# Altium footprint library rescap.PcbLib: 82 footprints (part 4 of 6)
Each footprint in its own frame and in the unit in brackets; x right, y up, seen from the top. Pads: shape width x height; smd on the part's side, far side on the other; paste and mask are expansions set on the pad; w line width, h text height; cw(c..) or ccw(c..) is an arc to the next point about the centre after c.
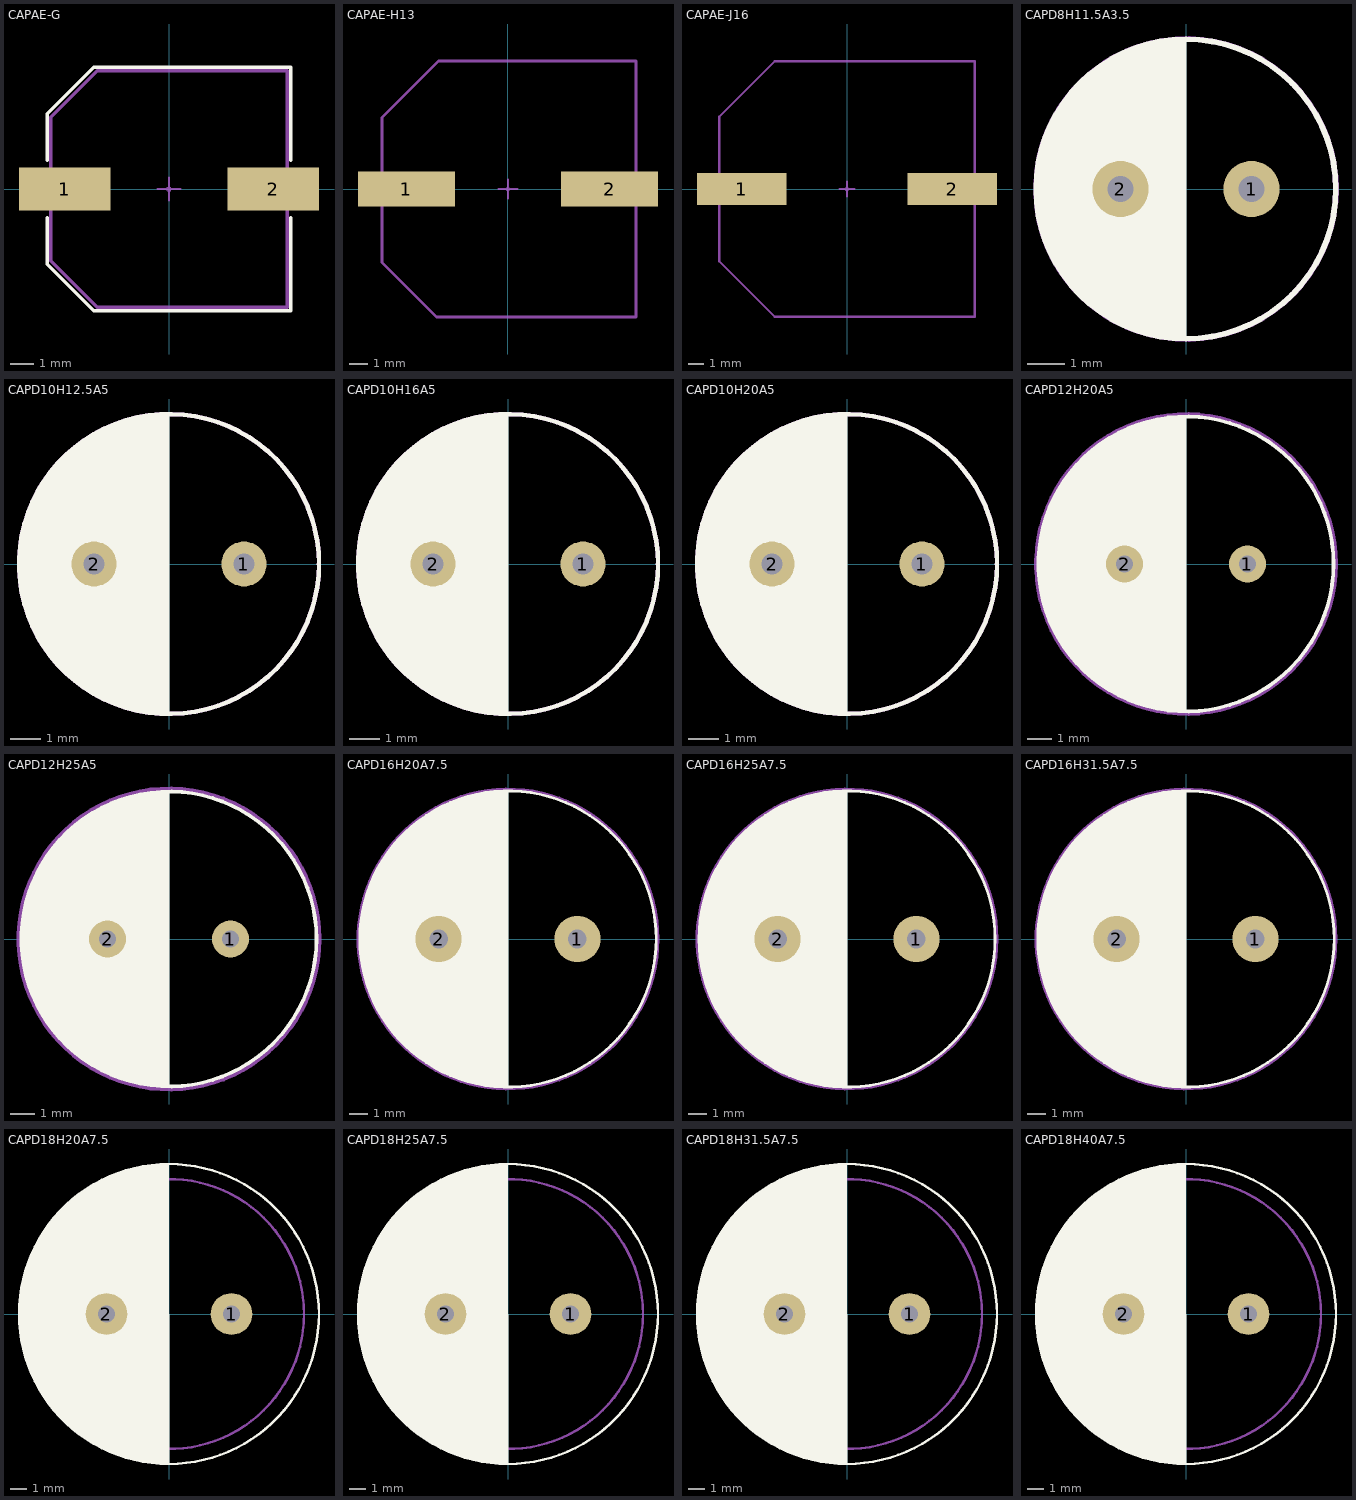
[diagram p3: the footprints below, top view; thin cyan lines are the x and y axes]

## CAPAE-G [mm] "Aluminum Electrolytic Capacitor, Body 10,30x10,30x10,20mm, IPC High Density"
height 10.2
pads (2):
  rect 3.95x1.85 smd: 1(-4.5,0) 2(4.5,0)
Top Overlay:
  lines w0.15: -5.25,-1.25 -5.25,-3.25 -3.25,-5.25 -3,-5.25 5.25,-5.25 5.25,-1.25 ; -5.25,1.25 -5.25,3.25 -3.25,5.25 -3,5.25 5.25,5.25 5.25,1.25
Top Courtyard:
  lines w0.05: -0.075,-0.075 0.075,-0.075 0.075,0.075 -0.075,0.075 -0.075,-0.075
  lines w0.1: -0.5,0 0.5,0 ; 0,-0.5 0,0.5
  lines w0.15: -5.1,-3.1 -5.1,-1 -5.1,1 -5.1,3.1 -3.1,5.1 5.1,5.1 5.1,1 5.1,-1 5.1,-5.1 -3.1,-5.1 -5.1,-3.1
3D body "CAPAE120103X102L.step": height 10.2, standoff 0, extent -6,-5.15 6,5.15

## CAPAE-H13 [mm] "Aluminum Electrolytic Capacitor, Body 13,50x13,50x13,50mm, IPC High Density"
height 13.5
pads (2):
  rect 5.15x1.85 smd: 1(-5.4,0) 2(5.4,0)
Top Courtyard:
  lines w0.05: -0.075,-0.075 -0.075,0.075 0.075,0.075 0.075,-0.075 -0.075,-0.075
  lines w0.1: -0.5,0 0.5,0 ; 0,-0.5 0,0.5
  lines w0.15: -6.7,-3.9 -6.7,-1.1 -6.7,1.1 -6.7,3.8 -3.7,6.8 6.8,6.8 6.8,1.1 6.8,-1.1 6.8,-6.8 -3.8,-6.8 -6.7,-3.9
3D body "CAPAE150135X135L.step": height 13.5, standoff 0, extent -7.5,-6.75 7.5,6.75

## CAPAE-J16 [mm] "Aluminum Electrolytic Capacitor, Body 17,00x17,00x16,50mm, IPC High Density"
height 16.5
pads (2):
  rect 5.95x2.15 smd: 1(-7,0) 2(7,0)
Top Courtyard:
  lines w0.05: -0.075,-0.075 0.075,-0.075 0.075,0.075 -0.075,0.075 -0.075,-0.075
  lines w0.1: -0.5,0 0.5,0 ; 0,-0.5 0,0.5
  lines w0.15: -8.5,-4.8 -4.8,-8.5 8.5,-8.5 8.5,-1.1 8.5,1.1 8.5,8.5 -4.8,8.5 -8.5,4.8 -8.5,1.1 -8.5,-1.1 -8.5,-4.8
3D body "CAPAE190170X165L.step": height 16.5, standoff 0, extent -9.5,-8.5 9.5,8.5

## CAPD8H11.5A3.5 [mm]
height 11.5
pads (2):
  round 1.5 hole 0.7: 1(1.75,0) 2(-1.75,0)
Top Overlay:
  circle w0.15: c0,0 r4
  region: 0,-4 -0.262,-4 -0.782,-3.932 -1.289,-3.796 -1.773,-3.595 -2.227,-3.333 -2.643,-3.014 -3.014,-2.643 -3.333,-2.227 -3.595,-1.773 -3.796,-1.289 -3.932,-0.782 -4,-0.262 -4,0 -4,0.262 -3.932,0.782 -3.796,1.289 -3.595,1.773 -3.333,2.227 -3.014,2.643 -2.643,3.014 -2.227,3.333 -1.773,3.595 -1.289,3.796 -0.782,3.932 -0.262,4 0,4
Mechanical 29:
  circle w0.15: c0,0 r4.005
  lines w0.15: -2.5,-1 -2.5,1
  text ".Designator" at -2.1,-0.3 h1
3D body "CAP D8 H11.5 A3.5.STEP": height 12, standoff -2.3, extent -4.01,-4 4,4

## CAPD10H12.5A5 [mm]
height 12.5
pads (2):
  round 1.5 hole 0.7: 1(2.5,0) 2(-2.5,0)
Top Overlay:
  circle w0.15: c0,0 r5
  region: 0,-5 -0.328,-5 -0.978,-4.914 -1.611,-4.745 -2.216,-4.494 -2.784,-4.166 -3.304,-3.767 -3.767,-3.304 -4.166,-2.784 -4.494,-2.216 -4.745,-1.611 -4.914,-0.978 -5,-0.328 -5,0 -5,0.328 -4.914,0.978 -4.745,1.611 -4.494,2.216 -4.166,2.784 -3.767,3.304 -3.304,3.767 -2.784,4.166 -2.216,4.494 -1.611,4.745 -0.978,4.914 -0.328,5 0,5
Mechanical 29:
  circle w0.15: c0,0 r5
  lines w0.15: -3.7,-1 -3.7,0 -3.7,1
  text ".Designator" at -2.7,-0.4 h1
3D body: height 12.5, standoff 0, extent -4.999,-4.999 4.999,4.999

## CAPD10H16A5 [mm]
height 16
pads (2):
  round 1.5 hole 0.7: 1(2.5,0) 2(-2.5,0)
Top Overlay:
  circle w0.15: c0,0 r5
  region: 0,-5 -0.328,-5 -0.978,-4.914 -1.611,-4.745 -2.216,-4.494 -2.784,-4.166 -3.304,-3.767 -3.767,-3.304 -4.166,-2.784 -4.494,-2.216 -4.745,-1.611 -4.914,-0.978 -5,-0.328 -5,0 -5,0.328 -4.914,0.978 -4.745,1.611 -4.494,2.216 -4.166,2.784 -3.767,3.304 -3.304,3.767 -2.784,4.166 -2.216,4.494 -1.611,4.745 -0.978,4.914 -0.328,5 0,5
Mechanical 29:
  circle w0.15: c0,0 r5
  lines w0.15: -3.7,-1 -3.7,0 -3.7,1
  text ".Designator" at -2.1,-0.3 h1
3D body: height 16, standoff 0, extent -4.999,-4.999 4.999,4.999

## CAPD10H20A5 [mm]
height 20
pads (2):
  round 1.5 hole 0.7: 1(2.5,0) 2(-2.5,0)
Top Overlay:
  circle w0.15: c0,0 r5
  region: 0,-5 -0.328,-5 -0.978,-4.914 -1.611,-4.745 -2.216,-4.494 -2.784,-4.166 -3.304,-3.767 -3.767,-3.304 -4.166,-2.784 -4.494,-2.216 -4.745,-1.611 -4.914,-0.978 -5,-0.328 -5,0 -5,0.328 -4.914,0.978 -4.745,1.611 -4.494,2.216 -4.166,2.784 -3.767,3.304 -3.304,3.767 -2.784,4.166 -2.216,4.494 -1.611,4.745 -0.978,4.914 -0.328,5 0,5
  pour cut-out: -2.5,-1.75 -2.672,-1.75 -3.01,-1.683 -3.329,-1.551 -3.616,-1.359 -3.859,-1.116 -4.051,-0.829 -4.183,-0.51 -4.25,-0.172 -4.25,0 -4.25,0.172 -4.183,0.51 -4.051,0.829 -3.859,1.116 -3.616,1.359 -3.329,1.551 -3.01,1.683 -2.672,1.75 -2.5,1.75 -2.328,1.75 -1.99,1.683 -1.671,1.551 -1.384,1.359 -1.141,1.116 -0.949,0.829 -0.817,0.51 -0.75,0.172 -0.75,0 -0.75,-0.172 -0.817,-0.51 -0.949,-0.829 -1.141,-1.116 -1.384,-1.359 -1.671,-1.551 -1.99,-1.683 -2.328,-1.75
Mechanical 29:
  circle w0.15: c0,0 r5
  lines w0.15: -3.7,-1 -3.7,0 -3.7,1
  text ".Designator" at -2.7,-0.2 h1
3D body: height 20, standoff 0, extent -4.999,-4.999 4.999,4.999

## CAPD12H20A5 [mm]
height 20
pads (2):
  round 1.5 hole 0.7: 1(2.5,0) 2(-2.5,0)
Top Overlay:
  circle w0.15: c0,0 r6
  region: 0,-6 -0.295,-6 -0.881,-5.942 -1.46,-5.827 -2.024,-5.656 -2.568,-5.43 -3.088,-5.153 -3.578,-4.825 -4.034,-4.451 -4.451,-4.034 -4.825,-3.579 -5.153,-3.088 -5.43,-2.568 -5.656,-2.024 -5.827,-1.46 -5.942,-0.881 -6,-0.295 -6,0 -6,0.295 -5.942,0.881 -5.827,1.46 -5.656,2.024 -5.43,2.568 -5.153,3.088 -4.825,3.578 -4.451,4.034 -4.034,4.451 -3.579,4.825 -3.088,5.153 -2.568,5.43 -2.024,5.656 -1.46,5.827 -0.881,5.942 -0.295,6 0,6
  pour cut-out: -2.5,-1.75 -2.672,-1.75 -3.01,-1.683 -3.329,-1.551 -3.616,-1.359 -3.859,-1.116 -4.051,-0.829 -4.183,-0.51 -4.25,-0.172 -4.25,0 -4.25,0.172 -4.183,0.51 -4.051,0.829 -3.859,1.116 -3.616,1.359 -3.329,1.551 -3.01,1.683 -2.672,1.75 -2.5,1.75 -2.328,1.75 -1.99,1.683 -1.671,1.551 -1.384,1.359 -1.141,1.116 -0.949,0.829 -0.817,0.51 -0.75,0.172 -0.75,0 -0.75,-0.172 -0.817,-0.51 -0.949,-0.829 -1.141,-1.116 -1.384,-1.359 -1.671,-1.551 -1.99,-1.683 -2.328,-1.75
Mechanical 29:
  circle w0.15: c0,0 r6.1
  lines w0.15: -3.7,-1 -3.7,0 -3.7,1
  text ".Designator" at -2.8,-0.4 h1
3D body: height 20, standoff 0, extent -6,-6 6,6

## CAPD12H25A5 [mm]
height 25
pads (2):
  round 1.5 hole 0.7: 1(2.5,0) 2(-2.5,0)
Top Overlay:
  circle w0.15: c0,0 r6
  pour cut-out: -2.5,-1.75 -2.672,-1.75 -3.01,-1.683 -3.329,-1.551 -3.616,-1.359 -3.859,-1.116 -4.051,-0.829 -4.183,-0.51 -4.25,-0.172 -4.25,0 -4.25,0.172 -4.183,0.51 -4.051,0.829 -3.859,1.116 -3.616,1.359 -3.329,1.551 -3.01,1.683 -2.672,1.75 -2.5,1.75 -2.328,1.75 -1.99,1.683 -1.671,1.551 -1.384,1.359 -1.141,1.116 -0.949,0.829 -0.817,0.51 -0.75,0.172 -0.75,0 -0.75,-0.172 -0.817,-0.51 -0.949,-0.829 -1.141,-1.116 -1.384,-1.359 -1.671,-1.551 -1.99,-1.683 -2.328,-1.75
  region: 0,-6 -0.295,-6 -0.881,-5.942 -1.46,-5.827 -2.024,-5.656 -2.568,-5.43 -3.088,-5.153 -3.578,-4.825 -4.034,-4.451 -4.451,-4.034 -4.825,-3.579 -5.153,-3.088 -5.43,-2.568 -5.656,-2.024 -5.827,-1.46 -5.942,-0.881 -6,-0.295 -6,0 -6,0.295 -5.942,0.881 -5.827,1.46 -5.656,2.024 -5.43,2.568 -5.153,3.088 -4.825,3.578 -4.451,4.034 -4.034,4.451 -3.579,4.825 -3.088,5.153 -2.568,5.43 -2.024,5.656 -1.46,5.827 -0.881,5.942 -0.295,6 0,6
Top Courtyard:
  circle w0.2: c0,0 r6.1
Mechanical 29:
  circle w0.15: c0,0 r6.101
  lines w0.15: -3.7,-1 -3.7,0 -3.7,1
  text ".Designator" at -2.6,-0.3 h1
3D body "User Library-Cap-EL(12_5x25-5).step": height 25.1, standoff -3.2, extent -6.252,-6.25 6.25,6.25

## CAPD16H20A7.5 [mm]
height 20
pads (2):
  round 2.5 hole 1: 1(3.75,0) 2(-3.75,0)
Top Overlay:
  circle w0.15: c0,0 r8
  region: 0,-8 -0.393,-8 -1.175,-7.923 -1.946,-7.77 -2.698,-7.541 -3.425,-7.241 -4.118,-6.87 -4.771,-6.433 -5.379,-5.935 -5.935,-5.379 -6.433,-4.771 -6.87,-4.118 -7.241,-3.425 -7.541,-2.698 -7.77,-1.946 -7.923,-1.175 -8,-0.393 -8,0 -8,0.393 -7.923,1.175 -7.77,1.946 -7.541,2.698 -7.241,3.425 -6.87,4.118 -6.433,4.771 -5.935,5.379 -5.379,5.935 -4.771,6.433 -4.118,6.87 -3.425,7.241 -2.698,7.541 -1.946,7.77 -1.175,7.923 -0.393,8 0,8
  pour cut-out: -3.75,-1.75 -3.922,-1.75 -4.26,-1.683 -4.579,-1.551 -4.866,-1.359 -5.109,-1.116 -5.301,-0.829 -5.433,-0.51 -5.5,-0.172 -5.5,0 -5.5,0.172 -5.433,0.51 -5.301,0.829 -5.109,1.116 -4.866,1.359 -4.579,1.551 -4.26,1.683 -3.922,1.75 -3.75,1.75 -3.578,1.75 -3.24,1.683 -2.921,1.551 -2.634,1.359 -2.391,1.116 -2.199,0.829 -2.067,0.51 -2,0.172 -2,0 -2,-0.172 -2.067,-0.51 -2.199,-0.829 -2.391,-1.116 -2.634,-1.359 -2.921,-1.551 -3.24,-1.683 -3.578,-1.75
Mechanical 29:
  circle w0.15: c0,0 r8.1
  lines w0.15: -3.7,-1 -3.7,0 -3.7,1
  text ".Designator" at -2.2,-0.4 h1
3D body: height 20, standoff 0, extent -7.999,-7.999 7.999,7.999

## CAPD16H25A7.5 [mm]
height 25
pads (2):
  round 2.5 hole 1: 1(3.75,0) 2(-3.75,0)
Top Overlay:
  circle w0.15: c0,0 r8
  region: 0,-8 -0.393,-8 -1.175,-7.923 -1.946,-7.77 -2.698,-7.541 -3.425,-7.241 -4.118,-6.87 -4.771,-6.433 -5.379,-5.935 -5.935,-5.379 -6.433,-4.771 -6.87,-4.118 -7.241,-3.425 -7.541,-2.698 -7.77,-1.946 -7.923,-1.175 -8,-0.393 -8,0 -8,0.393 -7.923,1.175 -7.77,1.946 -7.541,2.698 -7.241,3.425 -6.87,4.118 -6.433,4.771 -5.935,5.379 -5.379,5.935 -4.771,6.433 -4.118,6.87 -3.425,7.241 -2.698,7.541 -1.946,7.77 -1.175,7.923 -0.393,8 0,8
  pour cut-out: -3.75,-1.75 -3.922,-1.75 -4.26,-1.683 -4.579,-1.551 -4.866,-1.359 -5.109,-1.116 -5.301,-0.829 -5.433,-0.51 -5.5,-0.172 -5.5,0 -5.5,0.172 -5.433,0.51 -5.301,0.829 -5.109,1.116 -4.866,1.359 -4.579,1.551 -4.26,1.683 -3.922,1.75 -3.75,1.75 -3.578,1.75 -3.24,1.683 -2.921,1.551 -2.634,1.359 -2.391,1.116 -2.199,0.829 -2.067,0.51 -2,0.172 -2,0 -2,-0.172 -2.067,-0.51 -2.199,-0.829 -2.391,-1.116 -2.634,-1.359 -2.921,-1.551 -3.24,-1.683 -3.578,-1.75
Mechanical 29:
  circle w0.15: c0,0 r8.101
  lines w0.15: -3.7,-1 -3.7,0 -3.7,1
  text ".Designator" at -2.4,-0.3 h1
3D body: height 25, standoff 0, extent -7.999,-7.999 7.999,7.999

## CAPD16H31.5A7.5 [mm]
height 31.5
pads (2):
  round 2.5 hole 1: 1(3.75,0) 2(-3.75,0)
Top Overlay:
  circle w0.15: c0,0 r8
  region: 0,-8 -0.393,-8 -1.175,-7.923 -1.946,-7.77 -2.698,-7.541 -3.425,-7.241 -4.118,-6.87 -4.771,-6.433 -5.379,-5.935 -5.935,-5.379 -6.433,-4.771 -6.87,-4.118 -7.241,-3.425 -7.541,-2.698 -7.77,-1.946 -7.923,-1.175 -8,-0.393 -8,0 -8,0.393 -7.923,1.175 -7.77,1.946 -7.541,2.698 -7.241,3.425 -6.87,4.118 -6.433,4.771 -5.935,5.379 -5.379,5.935 -4.771,6.433 -4.118,6.87 -3.425,7.241 -2.698,7.541 -1.946,7.77 -1.175,7.923 -0.393,8 0,8
  pour cut-out: -3.75,-1.75 -3.922,-1.75 -4.26,-1.683 -4.579,-1.551 -4.866,-1.359 -5.109,-1.116 -5.301,-0.829 -5.433,-0.51 -5.5,-0.172 -5.5,0 -5.5,0.172 -5.433,0.51 -5.301,0.829 -5.109,1.116 -4.866,1.359 -4.579,1.551 -4.26,1.683 -3.922,1.75 -3.75,1.75 -3.578,1.75 -3.24,1.683 -2.921,1.551 -2.634,1.359 -2.391,1.116 -2.199,0.829 -2.067,0.51 -2,0.172 -2,0 -2,-0.172 -2.067,-0.51 -2.199,-0.829 -2.391,-1.116 -2.634,-1.359 -2.921,-1.551 -3.24,-1.683 -3.578,-1.75
Mechanical 29:
  circle w0.15: c0,0 r8.1
  lines w0.15: -3.7,-1 -3.7,0 -3.7,1
  text ".Designator" at -2.3,-0.2 h1
3D body: height 31.5, standoff 0, extent -7.999,-7.999 7.999,7.999

## CAPD18H20A7.5 [mm]
height 20
pads (2):
  round 2.5 hole 1: 1(3.75,0) 2(-3.75,0)
Top Overlay:
  circle w0.15: c0,0 r9
  pour cut-out: -3.75,-1.75 -3.922,-1.75 -4.26,-1.683 -4.579,-1.551 -4.866,-1.359 -5.109,-1.116 -5.301,-0.829 -5.433,-0.51 -5.5,-0.172 -5.5,0 -5.5,0.172 -5.433,0.51 -5.301,0.829 -5.109,1.116 -4.866,1.359 -4.579,1.551 -4.26,1.683 -3.922,1.75 -3.75,1.75 -3.578,1.75 -3.24,1.683 -2.921,1.551 -2.634,1.359 -2.391,1.116 -2.199,0.829 -2.067,0.51 -2,0.172 -2,0 -2,-0.172 -2.067,-0.51 -2.199,-0.829 -2.391,-1.116 -2.634,-1.359 -2.921,-1.551 -3.24,-1.683 -3.578,-1.75
  region: 0,-9 -0.442,-9 -1.322,-8.913 -2.189,-8.741 -3.036,-8.484 -3.853,-8.146 -4.633,-7.729 -5.368,-7.238 -6.051,-6.677 -6.677,-6.051 -7.238,-5.368 -7.729,-4.633 -8.146,-3.853 -8.484,-3.036 -8.741,-2.189 -8.913,-1.322 -9,-0.442 -9,0 -9,0.442 -8.913,1.322 -8.741,2.189 -8.484,3.036 -8.146,3.853 -7.729,4.632 -7.238,5.368 -6.677,6.051 -6.051,6.677 -5.368,7.238 -4.633,7.729 -3.853,8.146 -3.036,8.484 -2.189,8.741 -1.322,8.913 -0.442,9 0,9
Mechanical 29:
  circle w0.15: c0,0 r8.1
  lines w0.15: -3.7,-1 -3.7,0 -3.7,1
  text ".Designator" at -2.2,-0.4 h1
3D body: height 20, standoff 0, extent -9,-9 9,9

## CAPD18H25A7.5 [mm]
height 25
pads (2):
  round 2.5 hole 1: 1(3.75,0) 2(-3.75,0)
Top Overlay:
  circle w0.15: c0,0 r9
  pour cut-out: -3.75,-1.75 -3.922,-1.75 -4.26,-1.683 -4.579,-1.551 -4.866,-1.359 -5.109,-1.116 -5.301,-0.829 -5.433,-0.51 -5.5,-0.172 -5.5,0 -5.5,0.172 -5.433,0.51 -5.301,0.829 -5.109,1.116 -4.866,1.359 -4.579,1.551 -4.26,1.683 -3.922,1.75 -3.75,1.75 -3.578,1.75 -3.24,1.683 -2.921,1.551 -2.634,1.359 -2.391,1.116 -2.199,0.829 -2.067,0.51 -2,0.172 -2,0 -2,-0.172 -2.067,-0.51 -2.199,-0.829 -2.391,-1.116 -2.634,-1.359 -2.921,-1.551 -3.24,-1.683 -3.578,-1.75
  region: 0,-9 -0.442,-9 -1.322,-8.913 -2.189,-8.741 -3.036,-8.484 -3.853,-8.146 -4.633,-7.729 -5.368,-7.238 -6.051,-6.677 -6.677,-6.051 -7.238,-5.368 -7.729,-4.633 -8.146,-3.853 -8.484,-3.036 -8.741,-2.189 -8.913,-1.322 -9,-0.442 -9,0 -9,0.442 -8.913,1.322 -8.741,2.189 -8.484,3.036 -8.146,3.853 -7.729,4.632 -7.238,5.368 -6.677,6.051 -6.051,6.677 -5.368,7.238 -4.633,7.729 -3.853,8.146 -3.036,8.484 -2.189,8.741 -1.322,8.913 -0.442,9 0,9
Mechanical 29:
  circle w0.15: c0,0 r8.1
  lines w0.15: -3.7,-1 -3.7,0 -3.7,1
  text ".Designator" at -2.2,-0.4 h1
3D body: height 25, standoff 0, extent -9,-9 9,9

## CAPD18H31.5A7.5 [mm]
height 25
pads (2):
  round 2.5 hole 1: 1(3.75,0) 2(-3.75,0)
Top Overlay:
  circle w0.15: c0,0 r9
  pour cut-out: -3.75,-1.75 -3.922,-1.75 -4.26,-1.683 -4.579,-1.551 -4.866,-1.359 -5.109,-1.116 -5.301,-0.829 -5.433,-0.51 -5.5,-0.172 -5.5,0 -5.5,0.172 -5.433,0.51 -5.301,0.829 -5.109,1.116 -4.866,1.359 -4.579,1.551 -4.26,1.683 -3.922,1.75 -3.75,1.75 -3.578,1.75 -3.24,1.683 -2.921,1.551 -2.634,1.359 -2.391,1.116 -2.199,0.829 -2.067,0.51 -2,0.172 -2,0 -2,-0.172 -2.067,-0.51 -2.199,-0.829 -2.391,-1.116 -2.634,-1.359 -2.921,-1.551 -3.24,-1.683 -3.578,-1.75
  region: 0,-9 -0.442,-9 -1.322,-8.913 -2.189,-8.741 -3.036,-8.484 -3.853,-8.146 -4.633,-7.729 -5.368,-7.238 -6.051,-6.677 -6.677,-6.051 -7.238,-5.368 -7.729,-4.633 -8.146,-3.853 -8.484,-3.036 -8.741,-2.189 -8.913,-1.322 -9,-0.442 -9,0 -9,0.442 -8.913,1.322 -8.741,2.189 -8.484,3.036 -8.146,3.853 -7.729,4.632 -7.238,5.368 -6.677,6.051 -6.051,6.677 -5.368,7.238 -4.633,7.729 -3.853,8.146 -3.036,8.484 -2.189,8.741 -1.322,8.913 -0.442,9 0,9
Mechanical 29:
  circle w0.15: c0,0 r8.1
  lines w0.15: -3.7,-1 -3.7,0 -3.7,1
  text ".Designator" at -2.2,-0.4 h1
3D body: height 31.5, standoff 0, extent -9,-9 9,9

## CAPD18H40A7.5 [mm]
height 25
pads (2):
  round 2.5 hole 1: 1(3.75,0) 2(-3.75,0)
Top Overlay:
  circle w0.15: c0,0 r9
  pour cut-out: -3.75,-1.75 -3.922,-1.75 -4.26,-1.683 -4.579,-1.551 -4.866,-1.359 -5.109,-1.116 -5.301,-0.829 -5.433,-0.51 -5.5,-0.172 -5.5,0 -5.5,0.172 -5.433,0.51 -5.301,0.829 -5.109,1.116 -4.866,1.359 -4.579,1.551 -4.26,1.683 -3.922,1.75 -3.75,1.75 -3.578,1.75 -3.24,1.683 -2.921,1.551 -2.634,1.359 -2.391,1.116 -2.199,0.829 -2.067,0.51 -2,0.172 -2,0 -2,-0.172 -2.067,-0.51 -2.199,-0.829 -2.391,-1.116 -2.634,-1.359 -2.921,-1.551 -3.24,-1.683 -3.578,-1.75
  region: 0,-9 -0.442,-9 -1.322,-8.913 -2.189,-8.741 -3.036,-8.484 -3.853,-8.146 -4.633,-7.729 -5.368,-7.238 -6.051,-6.677 -6.677,-6.051 -7.238,-5.368 -7.729,-4.633 -8.146,-3.853 -8.484,-3.036 -8.741,-2.189 -8.913,-1.322 -9,-0.442 -9,0 -9,0.442 -8.913,1.322 -8.741,2.189 -8.484,3.036 -8.146,3.853 -7.729,4.632 -7.238,5.368 -6.677,6.051 -6.051,6.677 -5.368,7.238 -4.633,7.729 -3.853,8.146 -3.036,8.484 -2.189,8.741 -1.322,8.913 -0.442,9 0,9
Mechanical 29:
  circle w0.15: c0,0 r8.1
  lines w0.15: -3.7,-1 -3.7,0 -3.7,1
  text ".Designator" at -2.2,-0.4 h1
3D body: height 40, standoff 0, extent -9,-9 9,9